# Altium footprint library SMD_Bauteile.PcbLib: 355 footprints (part 11 of 23)
Each footprint in its own frame and in the unit in brackets; x right, y up, seen from the top. Pads: shape width x height; smd on the part's side, far side on the other; paste and mask are expansions set on the pad; w line width, h text height; cw(c..) or ccw(c..) is an arc to the next point about the centre after c.
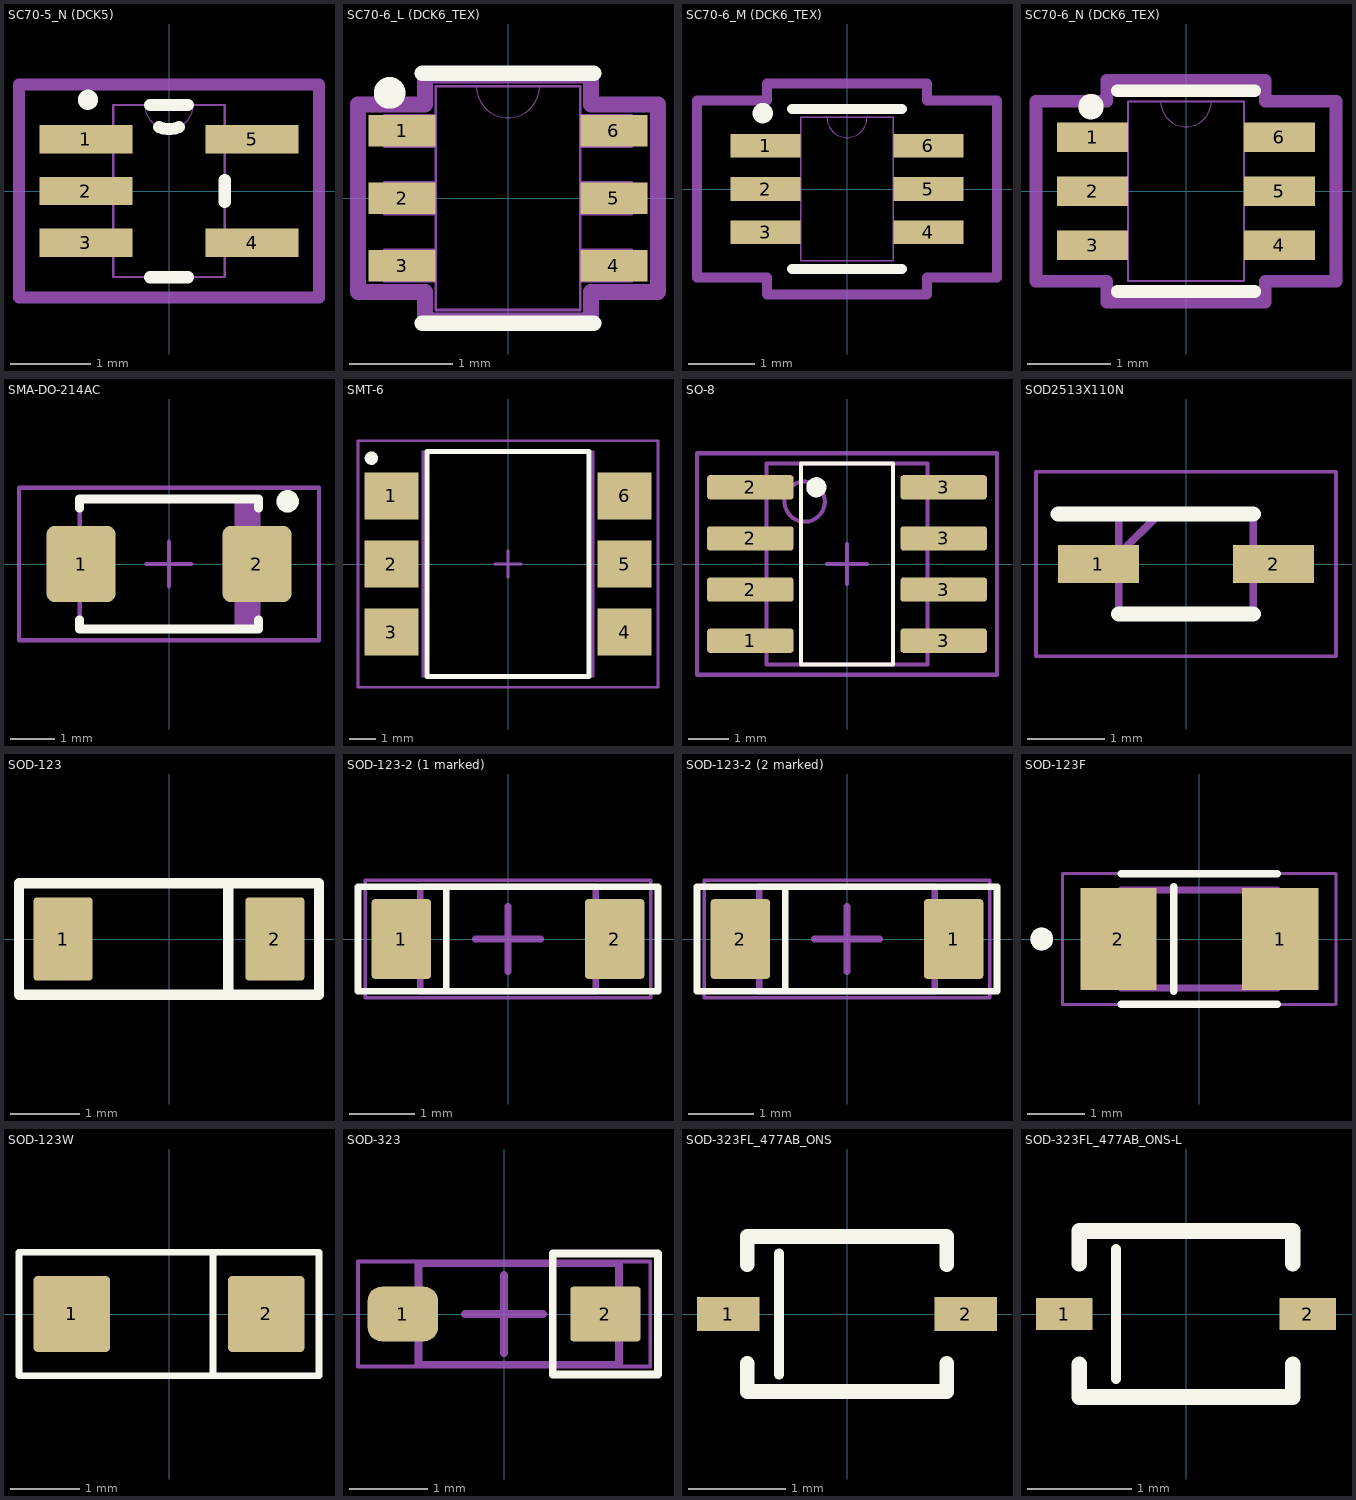
[diagram p10: the footprints below, top view; thin cyan lines are the x and y axes]

## SC70-5_N (DCK5) [mil]
height 43.31
pads (5):
  rect 46x14 smd: 1(-41,25.59) 2(-41,0) 3(-41,-25.59) 4(41,-25.59) 5(41,25.59)
Top Overlay:
  circle w10: c-40,45 r0.01
  lines w6: -9.43,-42.5 9.43,-42.5 ; -9.43,42.5 9.43,42.5 ; -4.9,31.55 ccw(c0,42.5) 4.9,31.55 ; 27.5,-5.49 27.5,5.49
Mech Misc 1:
  lines w0: -12,42.5 ccw(c0,42.5) 12,42.5
  lines w1: -47,-31.59 -27.5,-31.59 -27.5,-19.59 -47,-19.59 -47,-31.59 ; -47,-6 -27.5,-6 -27.5,6 -47,6 -47,-6 ; -47,19.59 -27.5,19.59 -27.5,31.59 -47,31.59 -47,19.59 ; -27.5,-42.5 -27.5,42.5 27.5,42.5 27.5,-42.5 -27.5,-42.5 ; 27.5,-31.59 47,-31.59 47,-19.59 27.5,-19.59 27.5,-31.59 ; 27.5,19.59 47,19.59 47,31.59 27.5,31.59 27.5,19.59
Mech 15:
  lines w6: -74,-52.5 74,-52.5 74,52.5 -74,52.5 -74,-52.5
3D body "SOT-SC70-5.stp": height 39.37, standoff 0, extent -41.33,-39.36 41.35,39.38

## SC70-6_L (DCK6_TEX) [mil]
height 43.31
pads (6):
  rect 25.5x12 smd paste+0 mask+0: 1(-40.25,25.59) 2(-40.25,0) 3(-40.25,-25.59) 4(40.25,-25.59) 5(40.25,0) 6(40.25,25.59)
Top Overlay:
  circle w10: c-45,40 r1
  lines w6: -32.5,-47.5 32.5,-47.5 ; -32.5,47.5 32.5,47.5
Mech Misc 1:
  lines w0: -12,42.5 ccw(c0,42.5) 12,42.5
  lines w1: -47,-31.59 -27.5,-31.59 -27.5,-19.59 -47,-19.59 -47,-31.59 ; -47,-6 -27.5,-6 -27.5,6 -47,6 -47,-6 ; -47,19.59 -27.5,19.59 -27.5,31.59 -47,31.59 -47,19.59 ; -27.5,-42.5 -27.5,42.5 27.5,42.5 27.5,-42.5 -27.5,-42.5 ; 27.5,-31.59 47,-31.59 47,-19.59 27.5,-19.59 27.5,-31.59 ; 27.5,-6 47,-6 47,6 27.5,6 27.5,-6 ; 27.5,19.59 47,19.59 47,31.59 27.5,31.59 27.5,19.59
Mech 15:
  lines w6: -57,-35.59 -31.5,-35.59 -31.5,-46.5 31.5,-46.5 31.5,-35.59 57,-35.59 57,35.59 31.5,35.59 31.5,46.5 -31.5,46.5 -31.5,35.59 -57,35.59 -57,-35.59
3D body: height 10, standoff 0, extent 0,0 10,10
3D body "SOIC_G14DCK3_TEX.step": height 43.11, standoff 0, extent -47,-42.52 47.01,42.52

## SC70-6_M (DCK6_TEX) [mil]
height 43.31
pads (6):
  rect 41.5x14 smd paste+0 mask+0: 1(-48.25,25.59) 2(-48.25,0) 3(-48.25,-25.59) 4(48.25,-25.59) 5(48.25,0) 6(48.25,25.59)
Top Overlay:
  circle w10: c-50,45 r1
  lines w6: -32.5,-47.5 32.5,-47.5 ; -32.5,47.5 32.5,47.5
Mech Misc 1:
  lines w0: -12,42.5 ccw(c0,42.5) 12,42.5
  lines w1: -47,-31.59 -47,-19.59 -27.5,-19.59 -27.5,-31.59 -47,-31.59 ; -47,-6 -47,6 -27.5,6 -27.5,-6 -47,-6 ; -47,19.59 -47,31.59 -27.5,31.59 -27.5,19.59 -47,19.59 ; -27.5,-42.5 27.5,-42.5 27.5,42.5 -27.5,42.5 -27.5,-42.5 ; 27.5,-31.59 27.5,-19.59 47,-19.59 47,-31.59 27.5,-31.59 ; 27.5,-6 27.5,6 47,6 47,-6 27.5,-6 ; 27.5,19.59 27.5,31.59 47,31.59 47,19.59 27.5,19.59
Mech 15:
  lines w6: -89,-52.59 -89,52.59 -47.5,52.59 -47.5,62.5 47.5,62.5 47.5,52.59 89,52.59 89,-52.59 47.5,-52.59 47.5,-62.5 -47.5,-62.5 -47.5,-52.59 -89,-52.59
3D body: height 10, standoff 0, extent 0,0 10,10
3D body "SOIC_G14DCK3_TEX.step": height 43.11, standoff 0, extent -47,-42.52 47.01,42.52

## SC70-6_N (DCK6_TEX) [mil]
height 43.31
pads (6):
  rect 33.5x14 smd paste+0 mask+0: 1(-44.25,25.59) 2(-44.25,0) 3(-44.25,-25.59) 4(44.25,-25.59) 5(44.25,0) 6(44.25,25.59)
Top Overlay:
  circle w10: c-45,40 r1
  lines w6: -32.5,-47.5 32.5,-47.5 ; -32.5,47.5 32.5,47.5
Mech Misc 1:
  lines w0: -12,42.5 ccw(c0,42.5) 12,42.5
  lines w1: -47,-31.59 -27.5,-31.59 -27.5,-19.59 -47,-19.59 -47,-31.59 ; -47,-6 -27.5,-6 -27.5,6 -47,6 -47,-6 ; -47,19.59 -27.5,19.59 -27.5,31.59 -47,31.59 -47,19.59 ; -27.5,-42.5 -27.5,42.5 27.5,42.5 27.5,-42.5 -27.5,-42.5 ; 27.5,-31.59 47,-31.59 47,-19.59 27.5,-19.59 27.5,-31.59 ; 27.5,-6 47,-6 47,6 27.5,6 27.5,-6 ; 27.5,19.59 47,19.59 47,31.59 27.5,31.59 27.5,19.59
Mech 15:
  lines w6: -71,-42.59 -37.5,-42.59 -37.5,-52.5 37.5,-52.5 37.5,-42.59 71,-42.59 71,42.59 37.5,42.59 37.5,52.5 -37.5,52.5 -37.5,42.59 -71,42.59 -71,-42.59
3D body: height 10, standoff 0, extent 0,0 10,10
3D body "SOIC_G14DCK3_TEX.step": height 43.11, standoff 0, extent -47,-42.51 47.02,42.53

## SMA-DO-214AC [mm] "Molded Diode, 2-Leads, Body 4,3x2,7mm, IPC Medium Density"
height 2.438
pads (2):
  rrect25% 1.55x1.7 smd: 1(-1.965,0) 2(1.965,0)
Top Overlay:
  circle w0.25: c2.65,1.4 r0.125
  lines w0.2: -2,-1.25 -2,-1.45 2,-1.45 2,-1.25 ; -2,1.25 -2,1.45 2,1.45 2,1.25
Mech Misc 1:
  rectangle: 1.458,-1.45 1.995,1.45
  lines w0.1: -1.995,-1.45 -1.995,1.45 1.995,1.45 1.995,-1.45 -1.995,-1.45
Mech 15:
  lines w0.1: -0.5,0 0.5,0 ; 0,-0.5 0,0.5 ; -3.35,-1.7 -3.35,1.7 3.35,1.7 3.35,-1.7 -3.35,-1.7
3D body: height 2.44, standoff 0, extent -1.995,-1.45 1.995,1.45

## SMT-6 [mm] "SOIC,2.54mm pitch;6 pin,6.35mm W X 8.38mm L X 4.43mm H body"
height 4.43
pads (6):
  rect 2x1.75 smd paste+0 mask+0: 1(-4.35,2.54) 2(-4.35,0) 3(-4.35,-2.54) 4(4.35,-2.54) 5(4.35,0) 6(4.35,2.54)
Top Overlay:
  circle w0.25: c-5.1,3.95 r0.125
  lines w0.2: -3.025,-4.2 -3.025,4.2 3.025,4.2 3.025,-4.2 -3.025,-4.2
Mechanical 3:
  text ".DESIGNATOR" at 0,0 h1.2
Mech Misc 1:
  lines w0.1: -3.175,-4.19 -3.175,4.19 3.175,4.19 3.175,-4.19 -3.175,-4.19
Mech 15:
  lines w0.1: -0.5,0 0.5,0 ; 0,-0.5 0,0.5 ; -5.6,-4.6 -5.6,4.6 5.6,4.6 5.6,-4.6 -5.6,-4.6
3D body: height 2.24, standoff 1.99, extent 3.848,1.777 4.102,3.302
3D body: height 2.11, standoff 0.13, extent 3.848,1.777 4.102,3.303
3D body: height 2.24, standoff 1.99, extent 3.175,1.777 3.975,3.303
3D body: height 0.25, standoff 0, extent 3.848,2.285 4.102,2.795
3D body: height 0.25, standoff 0, extent 3.975,2.285 4.89,2.795
3D body: height 2.24, standoff 1.99, extent 3.848,-0.763 4.102,0.762
3D body: height 2.11, standoff 0.13, extent 3.848,-0.763 4.102,0.763
3D body: height 2.24, standoff 1.99, extent 3.175,-0.763 3.975,0.763
3D body: height 0.25, standoff 0, extent 3.848,-0.255 4.102,0.255
3D body: height 0.25, standoff 0, extent 3.975,-0.255 4.89,0.255
3D body: height 2.24, standoff 1.99, extent 3.848,-3.303 4.102,-1.778
3D body: height 2.11, standoff 0.13, extent 3.848,-3.303 4.102,-1.777
3D body: height 2.24, standoff 1.99, extent 3.175,-3.303 3.975,-1.777
3D body: height 0.25, standoff 0, extent 3.848,-2.795 4.102,-2.285
3D body: height 0.25, standoff 0, extent 3.975,-2.795 4.89,-2.285
3D body: height 4.43, standoff 0.51, extent -3.175,-4.19 3.175,4.19
3D body: height 0.25, standoff 0, extent -4.89,2.285 -3.975,2.795
3D body: height 0.25, standoff 0, extent -4.102,2.285 -3.848,2.795
3D body: height 2.24, standoff 1.99, extent -3.975,1.777 -3.175,3.303
3D body: height 2.11, standoff 0.13, extent -4.102,1.777 -3.848,3.303
3D body: height 2.24, standoff 1.99, extent -4.102,1.778 -3.848,3.303
3D body: height 0.25, standoff 0, extent -4.89,-0.255 -3.975,0.255
3D body: height 0.25, standoff 0, extent -4.102,-0.255 -3.848,0.255
3D body: height 2.24, standoff 1.99, extent -3.975,-0.763 -3.175,0.763
3D body: height 2.11, standoff 0.13, extent -4.102,-0.763 -3.848,0.763
3D body: height 2.24, standoff 1.99, extent -4.102,-0.762 -3.848,0.763
3D body: height 0.25, standoff 0, extent -4.89,-2.795 -3.975,-2.285
3D body: height 0.25, standoff 0, extent -4.102,-2.795 -3.848,-2.285
3D body: height 2.24, standoff 1.99, extent -3.975,-3.303 -3.175,-1.777
3D body: height 2.11, standoff 0.13, extent -4.102,-3.303 -3.848,-1.777
3D body: height 2.24, standoff 1.99, extent -4.102,-3.302 -3.848,-1.777
3D body: height 4.44, standoff 4.43, extent -2.5,2.5 -1.5,3.5

## SO-8 [mm] "IRF9310PBF-1 ; Power MOSFET"
height 1.75
pads (8):
  rrect25% 2.15x0.6 smd: 1(-2.4,-1.905) 2(-2.4,-0.635) 2(-2.4,0.635) 2(-2.4,1.905) 3(2.4,-1.905) 3(2.4,-0.635) 3(2.4,0.635) 3(2.4,1.905)
Top Overlay:
  circle w0.25: c-0.762,1.905 r0.125
  lines w0.1: -1.143,-2.5 -1.143,2.5 1.143,2.5 1.143,-2.5 -1.143,-2.5
Mech Misc 1:
  circle w0.1: c-1.05,1.55 r0.5
  lines w0.1: -2,-2.5 -2,2.5 2,2.5 2,-2.5 -2,-2.5
Mech 15:
  lines w0.1: -0.5,0 0.5,0 ; 0,-0.5 0,0.5 ; -3.725,-2.75 -3.725,2.75 3.725,2.75 3.725,-2.75 -3.725,-2.75
3D body "so-8.stp": height 1.73, standoff -0.02, extent -3.131,-2.5 3.131,2.5

## SOD2513X110N [mm]
pads (2):
  rect 1.05x0.5 smd: 1(-1.138,0) 2(1.138,0)
Top Overlay:
  lines w0.2: -1.662,0.65 0.875,0.65 ; -0.875,-0.65 0.875,-0.65
Mech Misc 1:
  lines w0.1: -0.875,0.125 -0.35,0.65 ; -0.875,-0.65 -0.875,0.65 0.875,0.65 0.875,-0.65 -0.875,-0.65
Mech 15:
  lines w0.05: -1.95,-1.2 -1.95,1.2 1.95,1.2 1.95,-1.2 -1.95,-1.2
3D body "BAT60AE6327HTSA1.stp": height 1.1, standoff 0, extent -1.25,-0.65 1.25,0.65

## SOD-123 [mm] "SOD-123"
pads (2):
  rrect12% 0.85x1.2 smd: 1(-1.525,0) 2(1.525,0)
Top Overlay:
  lines w0.15: 0.85,-0.8 0.85,0.8 ; -2.159,-0.8 -2.159,0.8 2.159,0.8 2.159,-0.8 -2.159,-0.8
3D body "sod123.stp": height 0.79, standoff -0.01, extent -1.75,-0.8 1.75,0.8

## SOD-123-2 (1 marked) [mm] "SOD, 2-Leads, Body 2.69x1.6mm"
height 1.35
pads (2):
  rrect10% 0.91x1.22 smd: 1(-1.635,0) 2(1.635,0)
Top Overlay:
  lines w0.1: -0.95,-0.8 -0.95,0.8 ; -2.3,-0.8 2.3,-0.8 2.3,0.8 -2.3,0.8 -2.3,-0.8
Mech Misc 1:
  lines w0.1: -1.345,-0.8 1.345,-0.8 1.345,0.8 -1.345,0.8 -1.345,-0.8
Mech 15:
  lines w0.05: -2.19,-0.9 2.19,-0.9 2.19,0.9 -2.19,0.9 -2.19,-0.9
  lines w0.1: -0.5,0 0.5,0 ; 0,-0.5 0,0.5
3D body: height 1.35, standoff 0, extent -1.345,-0.8 1.345,0.8

## SOD-123-2 (2 marked) [mm] "SOD, 2-Leads, Body 2.69x1.6mm"
height 1.35
pads (2):
  rrect10% 0.91x1.22 smd: 1(1.635,0) 2(-1.635,0)
Top Overlay:
  lines w0.1: -0.95,-0.8 -0.95,0.8 ; -2.3,-0.8 -2.3,0.8 2.3,0.8 2.3,-0.8 -2.3,-0.8
Mech Misc 1:
  lines w0.1: -1.345,-0.8 -1.345,0.8 1.345,0.8 1.345,-0.8 -1.345,-0.8
Mech 15:
  lines w0.05: -2.19,-0.9 -2.19,0.9 2.19,0.9 2.19,-0.9 -2.19,-0.9
  lines w0.1: -0.5,0 0.5,0 ; 0,-0.5 0,0.5
3D body: height 1.35, standoff 0, extent -1.345,-0.8 1.345,0.8

## SOD-123F [mm]
pads (2):
  rect 1.34x1.8 smd: 1(1.425,0) 2(-1.425,0)
Top Overlay:
  circle w0.2: c-2.774,0 r0.1
  lines w0.127: -1.375,-1.15 1.375,-1.15 ; -1.375,1.15 1.375,1.15 ; -0.45,-0.925 -0.45,0.925
Mech Misc 1:
  circle w0.2: c-2.774,0 r0.1
  lines w0.127: -1.375,-0.863 -1.375,0.863 1.375,0.863 1.375,-0.863 -1.375,-0.863
Mech 15:
  lines w0.05: -2.405,-1.15 -2.405,1.15 2.405,1.15 2.405,-1.15 -2.405,-1.15
3D body "NRVS1MFL.stp": height 1.08, standoff 0, extent -1.775,-0.863 1.825,0.863

## SOD-123W [mm]
height 1
pads (2):
  rrect12% 1.1x1.1 smd: 1(-1.4,0) 2(1.4,0)
Top Overlay:
  lines w0.1: 0.635,-0.889 0.635,0.889 ; -2.159,-0.889 2.159,-0.889 2.159,0.889 -2.159,0.889 -2.159,-0.889
3D body "User Library-SOD123W.step": height 1.1, standoff -0.01, extent -2,-0.97 2,0.93

## SOD-323 [mm] "SOD, 2-Leads, Body 1.7x1.25mm"
height 1.062
pads (2):
  rrect50% 0.9x0.7 smd: 1(-1.3,0)
  rrect10% 0.9x0.7 smd: 2(1.3,0)
Top Overlay:
  lines w0.1: 0.625,-0.775 0.625,0.775 1.975,0.775 1.975,-0.775 0.625,-0.775
Top Component Center:
  lines w0.1: -0.5,0 0.5,0 ; 0,-0.5 0,0.5
Top Component Outline:
  lines w0.1: -1.1,-0.65 1.475,-0.65 1.475,0.65 -1.1,0.65 -1.1,-0.65
Top Courtyard (Mech26):
  lines w0.05: -1.875,-0.675 1.875,-0.675 1.875,0.675 -1.875,0.675 -1.875,-0.675
3D body "BAT165E6327HTSA1.stp": height 1.1, standoff 0, extent -1.251,-0.644 1.249,0.656

## SOD-323FL_477AB_ONS [mil]
pads (2):
  rect 25.37x14 smd paste+0 mask+0: 1(-48.19,0) 2(48.19,0)
Top Overlay:
  lines w3.94: -27.56,-24.61 -27.56,24.61
  lines w6: -40.5,-20.1 -40.5,-31.5 40.5,-31.5 40.5,-20.1 ; -40.5,20.1 -40.5,31.5 40.5,31.5 40.5,20.1
3D body "SOD-323FL_477AB_ONS.step": height 35.24, standoff 0, extent -52.99,-26.57 52.99,26.42

## SOD-323FL_477AB_ONS-L [mm]
pads (2):
  rect 0.544x0.306 smd paste+0 mask+0: 1(-1.174,0) 2(1.174,0)
Top Overlay:
  lines w0.1: -0.675,-0.625 -0.675,0.625
  lines w0.152: -1.029,-0.486 -1.029,-0.8 1.029,-0.8 1.029,-0.486 ; -1.029,0.486 -1.029,0.8 1.029,0.8 1.029,0.486
3D body "SOD-323FL_477AB_ONS.step": height 0.89, standoff 0, extent -1.346,-0.673 1.346,0.673